# Altium footprint library Mainboard.PcbLib: 37 footprints (part 1 of 3)
Each footprint in its own frame and in the unit in brackets; x right, y up, seen from the top. Pads: shape width x height; smd on the part's side, far side on the other; paste and mask are expansions set on the pad; w line width, h text height; cw(c..) or ccw(c..) is an arc to the next point about the centre after c.
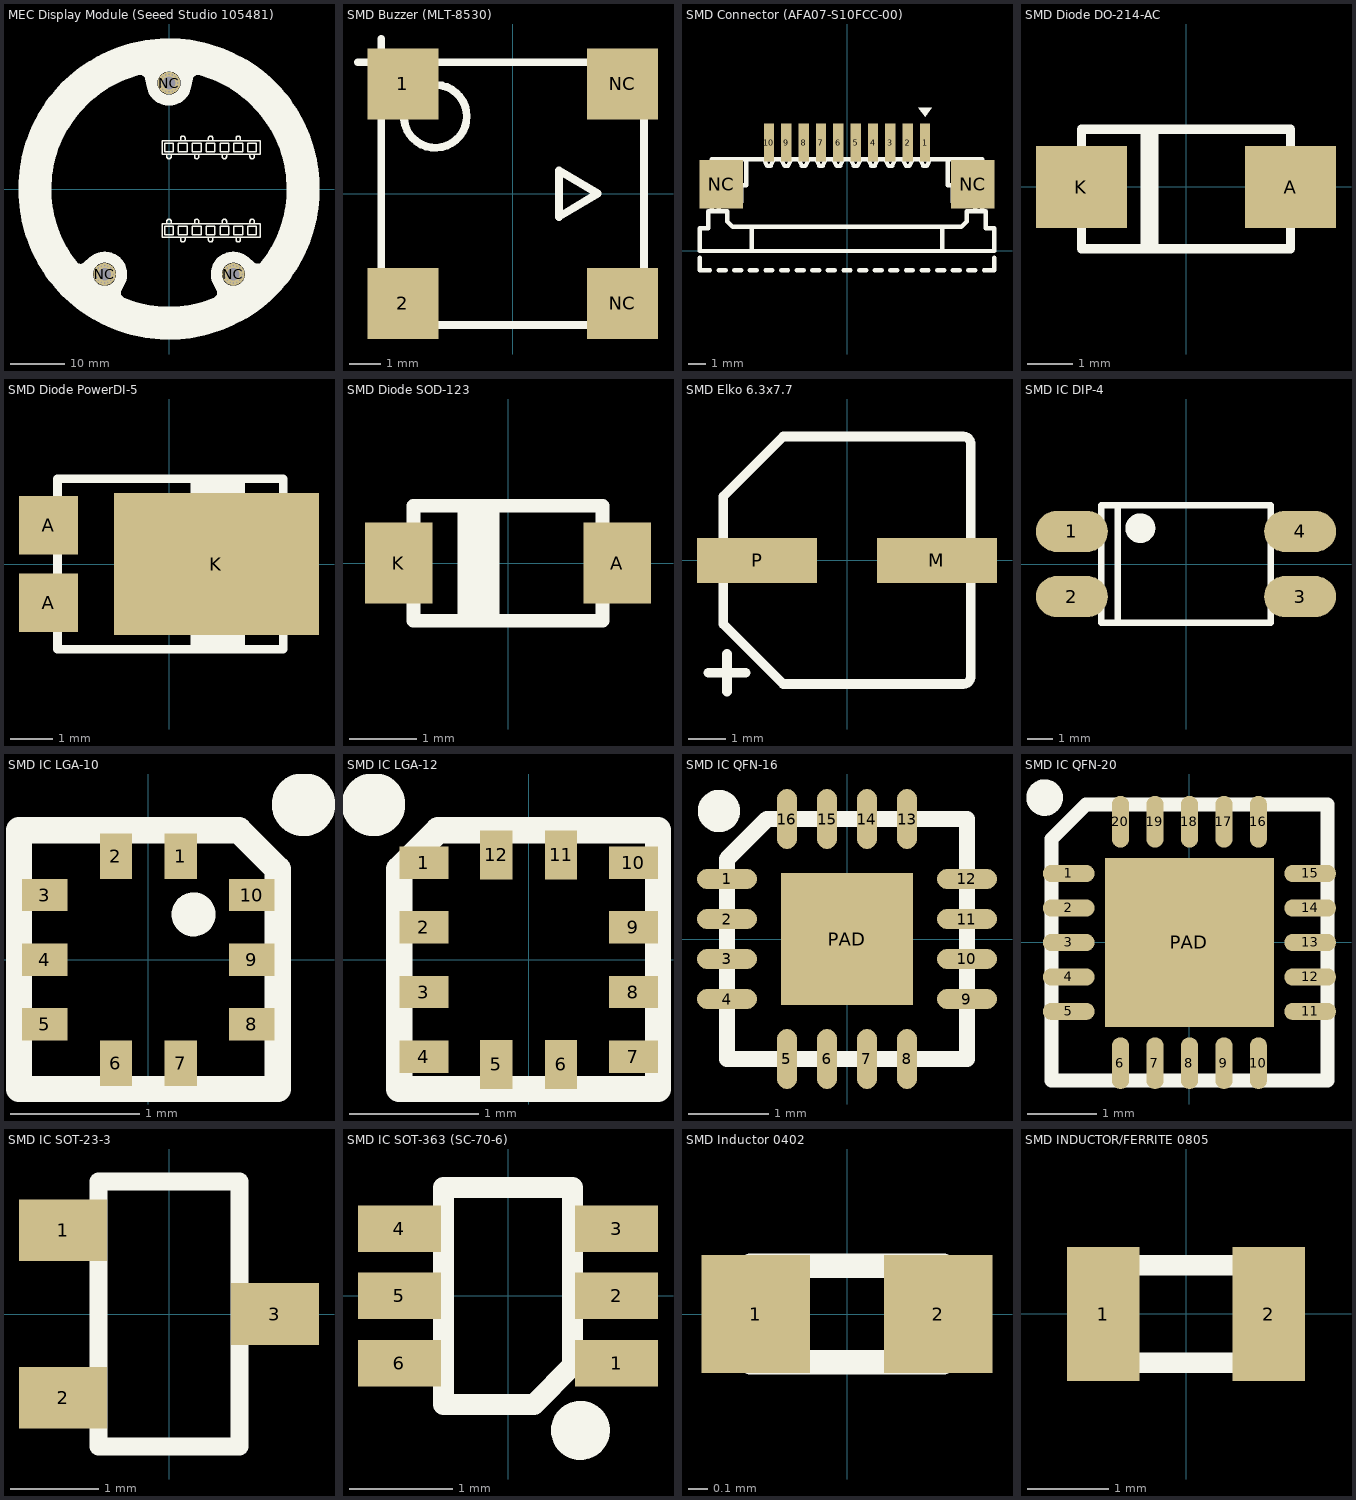
[diagram p0: the footprints below, top view; thin cyan lines are the x and y axes]

## MEC Display Module (Seeed Studio 105481) [mm]
pads (3):
  round 4.1 hole 2.3: NC(-11.811,-15.621) NC(0,19.431) NC(11.811,-15.621)
via 1.6,19.431 diameter 0.55 hole 0.3
via 1.478,20.043 diameter 0.55 hole 0.3
via 0.612,20.909 diameter 0.55 hole 0.3
via 1.131,20.562 diameter 0.55 hole 0.3
via 0,17.831 diameter 0.55 hole 0.3
via 0.612,17.953 diameter 0.55 hole 0.3
via 1.478,18.819 diameter 0.55 hole 0.3
via 1.131,18.3 diameter 0.55 hole 0.3
via -1.6,19.431 diameter 0.55 hole 0.3
via -1.478,18.819 diameter 0.55 hole 0.3
via -0.612,17.953 diameter 0.55 hole 0.3
via -1.131,18.3 diameter 0.55 hole 0.3
via 0,21.031 diameter 0.55 hole 0.3
via -0.612,20.909 diameter 0.55 hole 0.3
via -1.478,20.043 diameter 0.55 hole 0.3
via -1.131,20.562 diameter 0.55 hole 0.3
via -12.942,-14.49 diameter 0.55 hole 0.3
via -13.289,-15.009 diameter 0.55 hole 0.3
via -12.423,-14.143 diameter 0.55 hole 0.3
via -11.811,-14.021 diameter 0.55 hole 0.3
via -12.942,-16.752 diameter 0.55 hole 0.3
via -12.423,-17.099 diameter 0.55 hole 0.3
via -13.289,-16.233 diameter 0.55 hole 0.3
via -13.411,-15.621 diameter 0.55 hole 0.3
via -10.68,-16.752 diameter 0.55 hole 0.3
via -10.333,-16.233 diameter 0.55 hole 0.3
via -11.199,-17.099 diameter 0.55 hole 0.3
via -11.811,-17.221 diameter 0.55 hole 0.3
via -10.68,-14.49 diameter 0.55 hole 0.3
via -11.199,-14.143 diameter 0.55 hole 0.3
via -10.333,-15.009 diameter 0.55 hole 0.3
via -10.211,-15.621 diameter 0.55 hole 0.3
via 10.68,-14.49 diameter 0.55 hole 0.3
via 10.333,-15.009 diameter 0.55 hole 0.3
via 11.199,-14.143 diameter 0.55 hole 0.3
via 11.811,-14.021 diameter 0.55 hole 0.3
via 10.68,-16.752 diameter 0.55 hole 0.3
via 11.199,-17.099 diameter 0.55 hole 0.3
via 10.333,-16.233 diameter 0.55 hole 0.3
via 10.211,-15.621 diameter 0.55 hole 0.3
via 12.942,-16.752 diameter 0.55 hole 0.3
via 13.289,-16.233 diameter 0.55 hole 0.3
via 12.423,-17.099 diameter 0.55 hole 0.3
via 11.811,-17.221 diameter 0.55 hole 0.3
via 12.942,-14.49 diameter 0.55 hole 0.3
via 12.423,-14.143 diameter 0.55 hole 0.3
via 13.289,-15.009 diameter 0.55 hole 0.3
via 13.411,-15.621 diameter 0.55 hole 0.3
Top Overlay:
  drawing of 138 lines, arcs and shapes, not listed
3D body "M2 x 0.4mm Thread 10mm LONG SOCKET HEAD CAP SCREW.x_t": height 8.4, standoff -3.6, extent -1.9,17.534 1.9,21.328
3D body "Seeed Display.x_t": height 15.7, standoff 0.04, extent -27.492,-27.5 27.492,27.5
3D body "M2 x 0.4mm Thread 10mm LONG SOCKET HEAD CAP SCREW.x_t": height 8.4, standoff -3.6, extent -13.711,-17.518 -9.911,-13.724
3D body "M2 x 0.4mm Thread 10mm LONG SOCKET HEAD CAP SCREW.x_t": height 8.4, standoff -3.6, extent 9.911,-17.518 13.711,-13.724

## SMD Buzzer (MLT-8530) [mm] "SMD_LED_RED"
height 8.65
pads (4):
  rect 2.3x2.3 smd: 1(-3.55,3.55) 2(-3.55,-3.55) NC(3.55,-3.55) NC(3.55,3.55)
Top Overlay:
  circle w0.254: c-2.5,2.5 r1.016
  lines w0.254: -5,4.25 -3.5,4.25 ; -4.25,3.5 -4.25,5 ; -4.25,-2.75 -4.25,0 -4.25,2.75 -2.75,4.25 0,4.25 2.75,4.25 4.25,2.75 4.25,0 4.25,-2.75 2.75,-4.25 0,-4.25 -2.75,-4.25 -4.25,-2.75 ; 1.5,-0.75 1.5,0.75 2.75,0 1.5,-0.75
3D body "User Library-MLT-8530.x_t": height 3, standoff 0, extent -4.25,-4.25 4.25,4.25

## SMD Connector (AFA07-S10FCC-00) [mm] "SMD_LED_RED"
height 8.65
pads (12):
  rect 0.6x2.2 smd: 1(4.5,6.25) 2(3.5,6.25) 3(2.5,6.25) 4(1.5,6.25) 5(0.5,6.25) 6(-0.5,6.25) 7(-1.5,6.25) 8(-2.5,6.25) 9(-3.5,6.25) 10(-4.5,6.25)
  rect 2.5x2.8 smd: NC(-7.25,3.85) NC(7.25,3.85)
Top Overlay:
  region: 4.5,7.75 4.9,8.25 4.1,8.25
  lines w0.254: -8.5,-0.4 -8.5,-1.1 -8,-1.1 ; -8.2,-1.1 -7.9,-1.1 ; -7.8,2.3 -7.8,5.3 -5.8,5.3 ; -7.4,-1.1 -7,-1.1 ; -7.4,2.3 -7.4,5.3 ; -7.4,2.8 -6.1,2.8 -6.1,3.8 -5.8,3.8 -5.8,5.3 ; -6.5,-1.1 -6.1,-1.1 ; -5.6,-1.1 -5.2,-1.1 ; -5.5,0 -5.5,1.4 ; -4.8,5.3 -4.6,4.9 -4.5,4.9 -4.4,4.9 -4.2,5.3 ; -4.7,-1.1 -4.3,-1.1 ; -3.8,-1.1 -3.4,-1.1 ; -3.8,5.3 -3.6,4.9 -3.5,4.9 -3.4,4.9 -3.2,5.3 ; -2.9,-1.1 -2.5,-1.1 ; -2.8,5.3 -2.6,4.9 -2.5,4.9 -2.4,4.9 -2.2,5.3 ; -2,-1.1 -1.6,-1.1 ; -1.8,5.3 -1.6,4.9 -1.5,4.9 -1.4,4.9 -1.2,5.3 ; -1.1,-1.1 -0.7,-1.1 ; -0.8,5.3 -0.6,4.9 -0.5,4.9 -0.4,4.9 -0.2,5.3 ; -0.2,-1.1 0.2,-1.1 ; 0.2,5.3 0.4,4.9 0.5,4.9 0.6,4.9 0.8,5.3 ; 0.7,-1.1 1.1,-1.1 ; 1.2,5.3 1.4,4.9 1.5,4.9 1.6,4.9 1.8,5.3 ; 1.6,-1.1 2,-1.1 ; 2.2,5.3 2.4,4.9 2.5,4.9 2.6,4.9 2.8,5.3 ; 2.5,-1.1 2.9,-1.1 ; 3.2,5.3 3.4,4.9 3.5,4.9 3.6,4.9 3.8,5.3 ; 3.4,-1.1 3.8,-1.1 ; 4.2,5.3 4.4,4.9 4.5,4.9 4.6,4.9 4.8,5.3 ; 4.3,-1.1 4.7,-1.1 ; 5.2,-1.1 5.6,-1.1 ; 5.5,0 5.5,1.4 ; 6.1,-1.1 6.5,-1.1 ; 7,-1.1 7.4,-1.1 ; 7.4,2.3 7.4,5.3 ; 7.4,2.8 6.1,2.8 6.1,3.8 5.8,3.8 5.8,5.3 ; 7.8,2.3 7.8,5.3 5.8,5.3 ; 7.9,-1.1 8.2,-1.1 ; 8,-1.1 8.5,-1.1 8.5,-0.4 ; -5.8,5.3 0,5.3 5.8,5.3 ; -5.5,1.4 0,1.4 5.5,1.4 ; -5.5,1.4 -6.6,1.4 -6.9,1.7 -6.9,2.3 -8,2.3 -8,1.3 -8.5,1.3 -8.5,0 0,0 8.5,0 8.5,1.3 8,1.3 8,2.3 6.9,2.3 6.9,1.7 6.6,1.4 5.5,1.4
3D body "FFC3B07-10-G.x_b": height 2.57, standoff 0, extent -8.5,0 8.5,6.75

## SMD Diode DO-214-AC [mm] "SM LED; 2 Flat Leads"
height 1.3
pads (2):
  rect 2x1.8 smd: A(2.3,0) K(-2.3,0)
Top Overlay:
  lines w0.2: -0.9,-1.328 -0.9,1.2 ; -0.8,-1.328 -0.8,1.2 ; -0.7,-1.328 -0.7,1.2 ; -2.3,-1.358 2.3,-1.358 2.3,1.27 -2.3,1.27 -2.3,-1.358
3D body "User Library-S1G-1.step": height 2.7, standoff 0, extent -2.8,-1.475 2.8,1.475

## SMD Diode PowerDI-5 [mm] "SM LED; 2 Flat Leads"
height 1.3
pads (3):
  rect 1.4x1.39 smd: A(-2.862,-0.92) A(-2.862,0.92)
  rect 4.86x3.36 smd: K(1.12,0)
Top Overlay:
  rectangle: 0.5,-2.025 1.8,2.025
  lines w0.203: -2.65,-2.025 2.7,-2.025 2.7,2.025 -2.65,2.025 -2.65,-2.025
3D body "User Library-PowerDI-5.STEP": height 1.17, standoff 0.02, extent -3.275,-2.025 3.325,2.025

## SMD Diode SOD-123 [mm] "SM LED; 2 Flat Leads"
height 1.3
pads (2):
  rect 1x1.2 smd: A(1.62,0) K(-1.62,0)
Top Overlay:
  region: -0.125,0.875 -0.75,0.875 -0.75,-0.9 -0.125,-0.9
  lines w0.2: -1.4,-0.85 1.4,-0.85 ; -1.4,0.85 1.4,0.85
  lines w0.203: -1.4,-0.85 -1.4,0.85 ; 1.4,-0.85 1.4,0.85
3D body "User Library-SOD-123_DiodesInc.step": height 1.42, standoff -0.03, extent -1.925,-0.85 1.925,0.85

## SMD Elko 6.3x7.7 [mm]
pads (2):
  rect 3.2x1.2 smd: M(2.4,0) P(-2.4,0)
Top Overlay:
  lines w0.254: -3.7,-3 -2.7,-3 ; -3.2,-3.5 -3.2,-2.5 ; -3.3,-1.7 -3.3,0 -3.3,1.7 -1.7,3.3 0,3.3 3.1,3.3 cw(c3.1,3.1) 3.3,3.1 3.3,0 3.3,-3.1 cw(c3.1,-3.1) 3.1,-3.3 0,-3.3 -1.7,-3.3 -3.3,-1.7
3D body "User Library-ALU-D8.X_B": height 7.7, standoff 0, extent -3.5,-3.3 3.5,3.3

## SMD IC DIP-4 [mm] "SOIC, 20-Leads, Body 12.8x7.5mm, Pitch 1.27mm, IPC Low Density"
height 2.67
pads (4):
  oval 2.8x1.6 smd: 1(-4.445,1.27) 2(-4.445,-1.27) 3(4.445,-1.27) 4(4.445,1.27)
Top Overlay:
  circle w0.6: c-1.778,1.397 r0.28
  lines w0.254: -2.667,-2.286 -2.667,2.286 ; -3.302,-2.286 3.302,-2.286 3.302,2.286 -3.302,2.286 -3.302,-2.286
3D body "User Library-PC817_Gullwing.STEP": height 3.85, standoff 0, extent -5,-2.29 5,2.29

## SMD IC LGA-10 [mm] "QFN, 48-Leads, Body 7x7mm, Pitch 0.5mm, IPC Medium Density"
height 0.9
pads (10):
  rect 0.25x0.35 smd: 1(0.25,0.8) 2(-0.25,0.8) 6(-0.25,-0.8) 7(0.25,-0.8)
  rect 0.35x0.25 smd: 3(-0.8,0.5) 4(-0.8,0) 5(-0.8,-0.5) 8(0.8,-0.5) 9(0.8,0) 10(0.8,0.5)
Top Overlay:
  circle w0.25: c1.2,1.2 r0.12
  circle w0.18: c0.35,0.35 r0.08
  lines w0.203: -1,-1 1,-1 1,0.7 0.7,1 -1,1 -1,-1
3D body "Bosch BMP388.x_t": height 0.75, standoff 0, extent -1,-1 1,1

## SMD IC LGA-12 [mm] "QFN, 48-Leads, Body 7x7mm, Pitch 0.5mm, IPC Medium Density"
height 0.9
pads (12):
  rect 0.38x0.25 smd: 1(-0.81,0.75) 2(-0.81,0.25) 3(-0.81,-0.25) 4(-0.81,-0.75) 7(0.81,-0.75) 8(0.81,-0.25) 9(0.81,0.25) 10(0.81,0.75)
  rect 0.25x0.38 smd: 5(-0.25,-0.81) 6(0.25,-0.81) 11(0.25,0.81) 12(-0.25,0.81)
Top Overlay:
  circle w0.25: c-1.2,1.2 r0.12
  lines w0.203: -1,-1 1,-1 1,1 -0.7,1 -1,0.7 -1,-1
3D body "User Library-LGA12_LIS2DS12.X_T": height 0.96, standoff 0, extent -1,-1 1,1

## SMD IC QFN-16 [mm] "QFN, 48-Leads, Body 7x7mm, Pitch 0.5mm, IPC Medium Density"
height 0.9
pads (17):
  oval 0.75x0.25 smd: 1(-1.5,0.75) 2(-1.5,0.25) 3(-1.5,-0.25) 4(-1.5,-0.75) 9(1.5,-0.75) 10(1.5,-0.25) 11(1.5,0.25) 12(1.5,0.75)
  oval 0.25x0.75 smd: 5(-0.75,-1.5) 6(-0.25,-1.5) 7(0.25,-1.5) 8(0.75,-1.5) 13(0.75,1.5) 14(0.25,1.5) 15(-0.25,1.5) 16(-0.75,1.5)
  rect 1.65x1.65 smd: PAD(0,0)
Top Overlay:
  circle w0.28: c-1.6,1.6 r0.125
  lines w0.203: -1.5,-1.5 -1.5,1 -1,1.5 1.5,1.5 1.5,-1.5 -1.5,-1.5
3D body "User Library-QFN-16_3x3.X_B": height 0.9, standoff 0, extent -1.521,-1.521 1.521,1.521

## SMD IC QFN-20 [mm] "QFN, 48-Leads, Body 7x7mm, Pitch 0.5mm, IPC Medium Density"
height 0.9
pads (21):
  oval 0.75x0.25 smd: 1(-1.75,1) 2(-1.75,0.5) 3(-1.75,0) 4(-1.75,-0.5) 5(-1.75,-1) 11(1.75,-1) 12(1.75,-0.5) 13(1.75,0) 14(1.75,0.5) 15(1.75,1)
  oval 0.25x0.75 smd: 6(-1,-1.75) 7(-0.5,-1.75) 8(0,-1.75) 9(0.5,-1.75) 10(1,-1.75) 16(1,1.75) 17(0.5,1.75) 18(0,1.75) 19(-0.5,1.75) 20(-1,1.75)
  rect 2.45x2.45 smd: PAD(0,0)
Top Overlay:
  circle w0.28: c-2.1,2.1 r0.125
  lines w0.203: -2,-2 -2,1.5 -1.5,2 2,2 2,-2 -2,-2
3D body "User Library-QFN20_4x4x0_8.x_b": height 0.78, standoff -0.02, extent -2.01,-2.01 2.01,2.01

## SMD IC SOT-23-3 [mm]
pads (3):
  rect 1x0.7 smd: 1(-1.2,0.95) 2(-1.2,-0.95) 3(1.2,0)
Top Overlay:
  lines w0.203: -0.8,-1.5 -0.8,1.5 0.8,1.5 0.8,-1.5 -0.8,-1.5
3D body "CircuitWorks-SOT-23.step": height 1.1, standoff 0, extent -1.301,-1.5 1.199,1.5

## SMD IC SOT-363 (SC-70-6) [mm]
height 1.7
pads (6):
  rect 0.8x0.45 smd: 1(1.05,-0.65) 2(1.05,0) 3(1.05,0.65) 4(-1.05,0.65) 5(-1.05,0) 6(-1.05,-0.65)
Top Overlay:
  circle w0.37: c0.7,-1.3 r0.1
  lines w0.203: -0.625,-1.05 0.25,-1.05 0.625,-0.675 0.625,1.05 -0.625,1.05 -0.625,-1.05
3D body "User Library-SC70-6.step": height 0.92, standoff -0.03, extent -1.05,-1 1.05,1

## SMD Inductor 0402 [mm]
pads (2):
  rect 0.57x0.62 smd: 1(-0.48,0) 2(0.48,0)
Top Overlay:
  lines w0.127: -0.508,-0.254 -0.508,0.254 0.508,0.254 0.508,-0.254 -0.508,-0.254
3D body "User Library-FB_1005.STEP": height 0.5, standoff 0, extent -0.5,-0.25 0.5,0.25

## SMD INDUCTOR/FERRITE 0805 [mil]
height 66.93
pads (2):
  rect 35x65 smd: 1(-40,0) 2(40,0)
Top Overlay:
  lines w10: -40,-23.62 -40,23.62 40,23.62 40,-23.62 -40,-23.62
3D body "User Library-ind_0805.step": height 37.4, standoff 0, extent -39.36,-23.62 39.38,23.63